# Altium footprint library TranDangKhoa-LIB.PcbLib: 1435 footprints (part 60 of 90)
Each footprint in its own frame and in the unit in brackets; x right, y up, seen from the top. Pads: shape width x height; smd on the part's side, far side on the other; paste and mask are expansions set on the pad; w line width, h text height; cw(c..) or ccw(c..) is an arc to the next point about the centre after c.
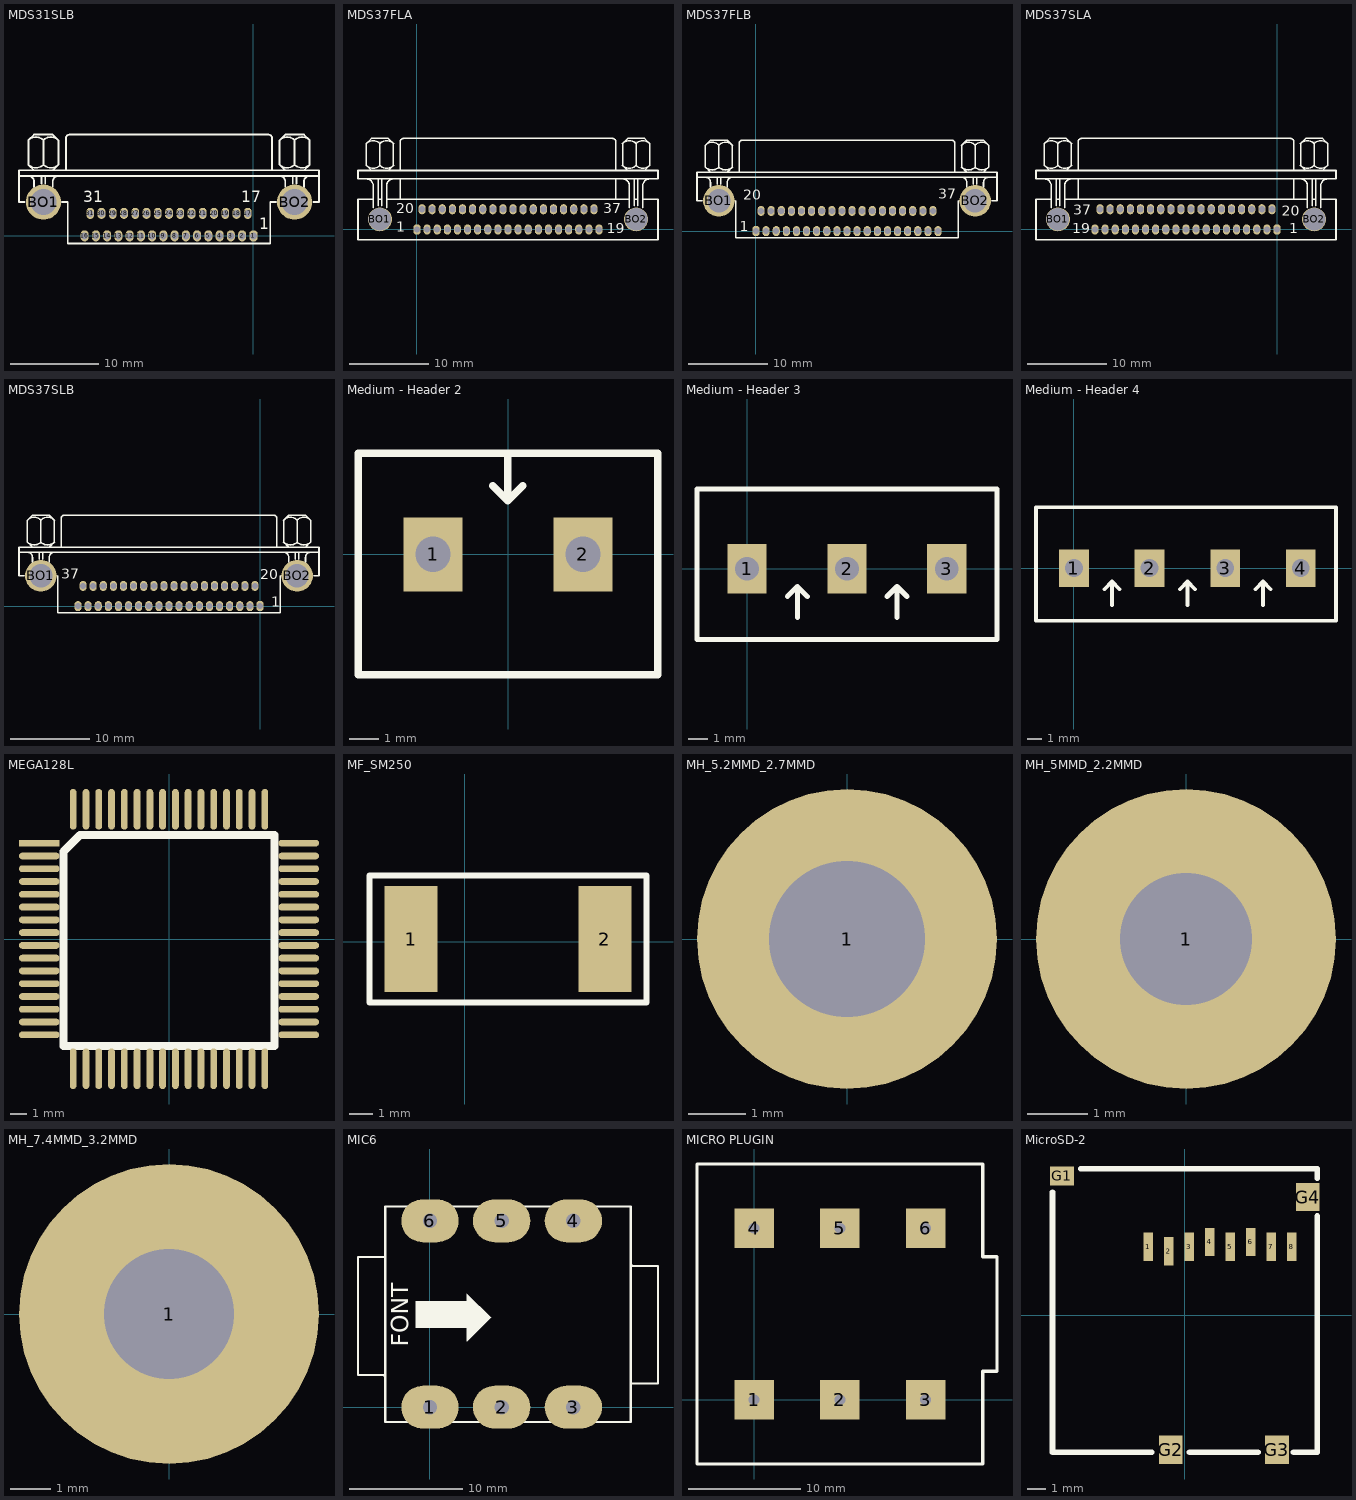
[diagram p59: the footprints below, top view; thin cyan lines are the x and y axes]

## MDS31SLB [mil]
pads (33):
  oct 35x50 hole 30: 1(0,0)
  oval 35x50 hole 30: 2(-50,0) 3(-100,0) 4(-150,0) 5(-200,0) 6(-250,0) 7(-300,0) 8(-350,0) 9(-400,0) 10(-450,0) 11(-500,0) 12(-550,0) 13(-600,0) 14(-650,0) 15(-700,0) 16(-750,0) 17(-25,100) 18(-75,100) 19(-125,100) 20(-175,100) 21(-225,100) 22(-275,100) 23(-325,100) 24(-375,100) 25(-425,100) 26(-475,100) 27(-525,100) 28(-575,100) 29(-625,100) 30(-675,100) 31(-725,100)
  round 156.67 hole 115: BO1(-933.33,150) BO2(183.33,150)
Top Overlay:
  lines w8: -1016.67,150 -1041.67,150 -1041.67,266.67 ; -1000.25,316.41 ccw(c-966.67,350) -933.08,316.41 ; -1000.25,425.25 cw(c-966.67,391.67) -933.08,425.25 ; -1000,266.67 cw(c-1000,241.67) -975,241.67 -975,216.67 ; -975,291.67 -1000,316.67 -1000,425 -975,450 -891.67,450 -866.67,425 -866.67,316.67 -891.67,291.67 ; -941.67,233.33 -941.67,266.67 ; -933.59,316.41 ccw(c-900,350) -866.41,316.41 ; -933.59,425.25 cw(c-900,391.67) -866.41,425.25 ; -933.33,316.67 -933.33,425 ; -925,233.33 -925,266.67 ; -891.67,216.67 -891.67,241.67 cw(c-866.67,241.67) -866.67,266.67 ; -850,150 -825,150 -825,-33.33 75,-33.33 75,150 100,150 ; -833.33,291.67 -833.33,433.33 cw(c-816.67,433.33) -816.67,450 66.67,450 cw(c66.67,433.33) 83.33,433.33 83.33,291.67 ; 116.41,316.41 ccw(c150,350) 183.59,316.41 ; 116.41,425.25 cw(c150,391.67) 183.59,425.25 ; 116.67,266.67 cw(c116.67,241.67) 141.67,241.67 141.67,216.67 ; 141.67,291.67 116.67,316.67 116.67,425 141.67,450 225,450 250,425 250,316.67 225,291.67 ; 175,233.33 175,266.67 ; 183.08,316.41 ccw(c216.67,350) 250.25,316.41 ; 183.08,425.25 cw(c216.67,391.67) 250.25,425.25 ; 183.33,316.67 183.33,425 ; 191.67,233.33 191.67,266.67 ; 225,216.67 225,241.67 cw(c250,241.67) 250,266.67 ; 266.67,150 291.67,150 291.67,266.67 ; -1041.67,266.67 -1041.67,291.67 291.67,291.67 291.67,266.67 ; -1041.67,266.67 291.67,266.67
  text "17" at -55,150 h50
  text "1" at 25,30 h50
  text "31" at -755,150 h50

## MDS37FLA [mil]
pads (39):
  oct 35x50 hole 30: 1(0,0)
  oval 35x50 hole 30: 2(50,0) 3(100,0) 4(150,0) 5(200,0) 6(250,0) 7(300,0) 8(350,0) 9(400,0) 10(450,0) 11(500,0) 12(550,0) 13(600,0) 14(650,0) 15(700,0) 16(750,0) 17(800,0) 18(850,0) 19(900,0) 20(25,100) 21(75,100) 22(125,100) 23(175,100) 24(225,100) 25(275,100) 26(325,100) 27(375,100) 28(425,100) 29(475,100) 30(525,100) 31(575,100) 32(625,100) 33(675,100) 34(725,100) 35(775,100) 36(825,100) 37(875,100)
  round 118.33 hole 110.83: BO1(-183.33,50) BO2(1083.33,50)
Top Overlay:
  lines w8: -250.25,316.41 ccw(c-216.67,350) -183.08,316.41 ; -250.25,425.25 cw(c-216.67,391.67) -183.08,425.25 ; -250,250 cw(c-250,216.67) -216.67,216.67 -216.67,108.33 ; -225,291.67 -250,316.67 -250,425 -225,450 -141.67,450 -116.67,425 -116.67,316.67 -141.67,291.67 ; -216.67,150 -291.67,150 -291.67,-50 1191.67,-50 1191.67,150 1116.67,150 ; -191.67,116.67 -191.67,250 ; -191.67,150 -175,150 ; -183.59,316.41 ccw(c-150,350) -116.41,316.41 ; -183.59,425.25 cw(c-150,391.67) -116.41,425.25 ; -183.33,316.67 -183.33,425 ; -175,116.67 -175,250 ; -150,108.33 -150,216.67 cw(c-116.67,216.67) -116.67,250 ; -150,150 466.67,150 1050,150 ; -83.33,150 -83.33,250 ; -83.33,291.67 -83.33,433.33 cw(c-66.67,433.33) -66.67,450 966.67,450 cw(c966.67,433.33) 983.33,433.33 983.33,291.67 ; 983.33,150 983.33,250 ; 1016.41,316.41 ccw(c1050,350) 1083.59,316.41 ; 1016.41,425.25 cw(c1050,391.67) 1083.59,425.25 ; 1016.67,250 cw(c1016.67,216.67) 1050,216.67 1050,108.33 ; 1041.67,291.67 1016.67,316.67 1016.67,425 1041.67,450 1125,450 1150,425 1150,316.67 1125,291.67 ; 1075,116.67 1075,250 ; 1075,150 1091.67,150 ; 1083.08,316.41 ccw(c1116.67,350) 1150.25,316.41 ; 1083.08,425.25 cw(c1116.67,391.67) 1150.25,425.25 ; 1083.33,316.67 1083.33,425 ; 1091.67,116.67 1091.67,250 ; 1116.67,108.33 1116.67,216.67 cw(c1150,216.67) 1150,250 ; -291.67,250 1191.67,250 1191.67,291.67 -291.67,291.67 -291.67,250
  text "20" at -102.26,80.96 h50
  text "19" at 938.95,-18.18 h50
  text "37" at 920,80 h50
  text "1" at -101.58,-12.53 h50

## MDS37FLB [mil]
pads (39):
  oct 35x50 hole 30: 1(0,0)
  oval 35x50 hole 30: 2(50,0) 3(100,0) 4(150,0) 5(200,0) 6(250,0) 7(300,0) 8(350,0) 9(400,0) 10(450,0) 11(500,0) 12(550,0) 13(600,0) 14(650,0) 15(700,0) 16(750,0) 17(800,0) 18(850,0) 19(900,0) 20(25,100) 21(75,100) 22(125,100) 23(175,100) 24(225,100) 25(275,100) 26(325,100) 27(375,100) 28(425,100) 29(475,100) 30(525,100) 31(575,100) 32(625,100) 33(675,100) 34(725,100) 35(775,100) 36(825,100) 37(875,100)
  round 156.67 hole 115: BO1(-183.33,150) BO2(1083.33,150)
Top Overlay:
  lines w8: -266.67,150 -291.67,150 -291.67,266.67 ; -250.25,316.41 ccw(c-216.67,350) -183.08,316.41 ; -250.25,425.25 cw(c-216.67,391.67) -183.08,425.25 ; -250,266.67 cw(c-250,241.67) -225,241.67 -225,216.67 ; -225,291.67 -250,316.67 -250,425 -225,450 -141.67,450 -116.67,425 -116.67,316.67 -141.67,291.67 ; -191.67,233.33 -191.67,266.67 ; -183.59,316.41 ccw(c-150,350) -116.41,316.41 ; -183.59,425.25 cw(c-150,391.67) -116.41,425.25 ; -183.33,316.67 -183.33,425 ; -175,233.33 -175,266.67 ; -141.67,216.67 -141.67,241.67 cw(c-116.67,241.67) -116.67,266.67 ; -100,150 -100,-33.33 1000,-33.33 1000,150 ; -83.33,291.67 -83.33,433.33 cw(c-66.67,433.33) -66.67,450 966.67,450 cw(c966.67,433.33) 983.33,433.33 983.33,291.67 ; 1016.41,316.41 ccw(c1050,350) 1083.59,316.41 ; 1016.41,425.25 cw(c1050,391.67) 1083.59,425.25 ; 1016.67,266.67 cw(c1016.67,241.67) 1041.67,241.67 1041.67,216.67 ; 1041.67,291.67 1016.67,316.67 1016.67,425 1041.67,450 1125,450 1150,425 1150,316.67 1125,291.67 ; 1075,233.33 1075,266.67 ; 1083.08,316.41 ccw(c1116.67,350) 1150.25,316.41 ; 1083.08,425.25 cw(c1116.67,391.67) 1150.25,425.25 ; 1083.33,316.67 1083.33,425 ; 1091.67,233.33 1091.67,266.67 ; 1125,216.67 1125,241.67 cw(c1150,241.67) 1150,266.67 ; 1166.67,150 1191.67,150 1191.67,266.67 ; -291.67,266.67 -291.67,291.67 1191.67,291.67 1191.67,266.67 ; -291.67,266.67 1191.67,266.67
  text "37" at 900,160 h50
  text "20" at -62.44,156.33 h50
  text "1" at -80,0 h50

## MDS37SLA [mil]
pads (39):
  oct 35x50 hole 30: 1(0,0)
  oval 35x50 hole 30: 2(-50,0) 3(-100,0) 4(-150,0) 5(-200,0) 6(-250,0) 7(-300,0) 8(-350,0) 9(-400,0) 10(-450,0) 11(-500,0) 12(-550,0) 13(-600,0) 14(-650,0) 15(-700,0) 16(-750,0) 17(-800,0) 18(-850,0) 19(-900,0) 20(-25,100) 21(-75,100) 22(-125,100) 23(-175,100) 24(-225,100) 25(-275,100) 26(-325,100) 27(-375,100) 28(-425,100) 29(-475,100) 30(-525,100) 31(-575,100) 32(-625,100) 33(-675,100) 34(-725,100) 35(-775,100) 36(-825,100) 37(-875,100)
  round 118.33 hole 110.83: BO1(-1083.33,50) BO2(183.33,50)
Top Overlay:
  lines w8: -1150.25,316.41 ccw(c-1116.67,350) -1083.08,316.41 ; -1150.25,425.25 cw(c-1116.67,391.67) -1083.08,425.25 ; -1150,250 cw(c-1150,216.67) -1116.67,216.67 -1116.67,108.33 ; -1125,291.67 -1150,316.67 -1150,425 -1125,450 -1041.67,450 -1016.67,425 -1016.67,316.67 -1041.67,291.67 ; -1116.67,150 -1191.67,150 -1191.67,-50 291.67,-50 291.67,150 216.67,150 ; -1091.67,116.67 -1091.67,250 ; -1091.67,150 -1075,150 ; -1083.59,316.41 ccw(c-1050,350) -1016.41,316.41 ; -1083.59,425.25 cw(c-1050,391.67) -1016.41,425.25 ; -1083.33,316.67 -1083.33,425 ; -1075,116.67 -1075,250 ; -1050,108.33 -1050,216.67 cw(c-1016.67,216.67) -1016.67,250 ; -1050,150 150,150 ; -983.33,150 -983.33,250 ; -983.33,291.67 -983.33,433.33 cw(c-966.67,433.33) -966.67,450 66.67,450 cw(c66.67,433.33) 83.33,433.33 83.33,291.67 ; 83.33,150 83.33,250 ; 116.41,316.41 ccw(c150,350) 183.59,316.41 ; 116.41,425.25 cw(c150,391.67) 183.59,425.25 ; 116.67,250 cw(c116.67,216.67) 150,216.67 150,108.33 ; 141.67,291.67 116.67,316.67 116.67,425 141.67,450 225,450 250,425 250,316.67 225,291.67 ; 175,116.67 175,250 ; 175,150 191.67,150 ; 183.08,316.41 ccw(c216.67,350) 250.25,316.41 ; 183.08,425.25 cw(c216.67,391.67) 250.25,425.25 ; 183.33,316.67 183.33,425 ; 191.67,116.67 191.67,250 ; 216.67,108.33 216.67,216.67 cw(c250,216.67) 250,250 ; -1191.67,250 -1191.67,291.67 291.67,291.67 291.67,250 -1191.67,250
  text "1" at 60,-20 h50
  text "19" at -1012.73,-18.18 h50
  text "37" at -1006.58,73.44 h50
  text "20" at 23.98,68.07 h50

## MDS37SLB [mil]
pads (39):
  oct 35x50 hole 30: 1(0,0)
  oval 35x50 hole 30: 2(-50,0) 3(-100,0) 4(-150,0) 5(-200,0) 6(-250,0) 7(-300,0) 8(-350,0) 9(-400,0) 10(-450,0) 11(-500,0) 12(-550,0) 13(-600,0) 14(-650,0) 15(-700,0) 16(-750,0) 17(-800,0) 18(-850,0) 19(-900,0) 20(-25,100) 21(-75,100) 22(-125,100) 23(-175,100) 24(-225,100) 25(-275,100) 26(-325,100) 27(-375,100) 28(-425,100) 29(-475,100) 30(-525,100) 31(-575,100) 32(-625,100) 33(-675,100) 34(-725,100) 35(-775,100) 36(-825,100) 37(-875,100)
  round 156.67 hole 115: BO1(-1083.33,150) BO2(183.33,150)
Top Overlay:
  lines w8: -1166.67,150 -1191.67,150 -1191.67,266.67 ; -1150.25,316.41 ccw(c-1116.67,350) -1083.08,316.41 ; -1150.25,425.25 cw(c-1116.67,391.67) -1083.08,425.25 ; -1150,266.67 cw(c-1150,241.67) -1125,241.67 -1125,216.67 ; -1125,291.67 -1150,316.67 -1150,425 -1125,450 -1041.67,450 -1016.67,425 -1016.67,316.67 -1041.67,291.67 ; -1091.67,233.33 -1091.67,266.67 ; -1083.59,316.41 ccw(c-1050,350) -1016.41,316.41 ; -1083.59,425.25 cw(c-1050,391.67) -1016.41,425.25 ; -1083.33,316.67 -1083.33,425 ; -1075,233.33 -1075,266.67 ; -1041.67,216.67 -1041.67,241.67 cw(c-1016.67,241.67) -1016.67,266.67 ; -1000,150 -1000,-33.33 100,-33.33 100,150 ; -983.33,291.67 -983.33,433.33 cw(c-966.67,433.33) -966.67,450 66.67,450 cw(c66.67,433.33) 83.33,433.33 83.33,291.67 ; 116.41,316.41 ccw(c150,350) 183.59,316.41 ; 116.41,425.25 cw(c150,391.67) 183.59,425.25 ; 116.67,266.67 cw(c116.67,241.67) 141.67,241.67 141.67,216.67 ; 141.67,291.67 116.67,316.67 116.67,425 141.67,450 225,450 250,425 250,316.67 225,291.67 ; 175,233.33 175,266.67 ; 183.08,316.41 ccw(c216.67,350) 250.25,316.41 ; 183.08,425.25 cw(c216.67,391.67) 250.25,425.25 ; 183.33,316.67 183.33,425 ; 191.67,233.33 191.67,266.67 ; 225,216.67 225,241.67 cw(c250,241.67) 250,266.67 ; 266.67,150 291.67,150 291.67,266.67 ; -1191.67,266.67 -1191.67,291.67 291.67,291.67 291.67,266.67 ; -1191.67,266.67 291.67,266.67
  text "1" at 56.69,-2.62 h50
  text "20" at 1.59,133.35 h50
  text "37" at -982.06,136.6 h50

## Medium - Header 2 [mm]
pads (2):
  rect 2x2.5 hole 1.2: 1(-2.54,0) 2(2.54,0)
Top Overlay:
  lines w0.254: -0.521,2.324 -0.013,1.816 ; -0.013,3.378 -0.013,1.816 ; 0.495,2.324 -0.013,1.816 ; -5.08,-4.077 5.08,-4.077 5.08,3.429 -5.08,3.429 -5.08,-4.077
3D body "SW3dPS-KRM2.STEP": height 10, standoff -4, extent -5,-4.071 5,3.429

## Medium - Header 3 [mm]
pads (3):
  rect 2x2.5 hole 1.2: 1(0,0) 2(5.08,0) 3(10.147,0)
Top Overlay:
  lines w0.254: 2.045,-1.41 2.553,-0.902 ; 2.553,-2.464 2.553,-0.902 ; 3.061,-1.41 2.553,-0.902 ; 7.112,-1.41 7.62,-0.902 ; 7.62,-2.464 7.62,-0.902 ; 8.128,-1.41 7.62,-0.902 ; -2.54,-3.581 12.7,-3.581 12.7,4.064 -2.54,4.064 -2.54,-3.581
3D body "SW3DPS-HDR1x3-MED-GREEN.STEP": height 10, standoff -4, extent -2.42,-3.505 12.58,3.995

## Medium - Header 4 [mm]
pads (4):
  rect 2x2.5 hole 1.2: 1(0,0) 2(5.08,0) 3(10.147,0) 4(15.215,0)
Top Overlay:
  lines w0.254: 2.045,-1.41 2.553,-0.902 ; 2.553,-2.464 2.553,-0.902 ; 3.061,-1.41 2.553,-0.902 ; 7.112,-1.41 7.62,-0.902 ; 7.62,-2.464 7.62,-0.902 ; 8.128,-1.41 7.62,-0.902 ; 12.179,-1.41 12.687,-0.902 ; 12.687,-2.464 12.687,-0.902 ; 13.195,-1.41 12.687,-0.902 ; -2.54,-3.531 17.577,-3.531 17.577,4.089 -2.54,4.089 -2.54,-3.531
3D body "SW3DPS-HDR1x4-MED-GREEN.STEP": height 10, standoff -4, extent -2.431,-3.461 17.569,4.039

## MEGA128L [mm]
pads (64):
  rect 2.54x0.432 smd: 1(-8.125,6)
  oval 2.54x0.432 smd: 2(-8.125,5.2) 3(-8.125,4.4) 4(-8.125,3.6) 5(-8.125,2.8) 6(-8.125,2) 7(-8.125,1.2) 8(-8.125,0.4) 9(-8.125,-0.4) 10(-8.125,-1.2) 11(-8.125,-2) 12(-8.125,-2.8) 13(-8.125,-3.6) 14(-8.125,-4.4) 15(-8.125,-5.2) 16(-8.125,-6) 33(8.125,-6) 34(8.125,-5.2) 35(8.125,-4.4) 36(8.125,-3.6) 37(8.125,-2.8) 38(8.125,-2) 39(8.125,-1.2) 40(8.125,-0.4) 41(8.125,0.4) 42(8.125,1.2) 43(8.125,2) 44(8.125,2.8) 45(8.125,3.6) 46(8.125,4.4) 47(8.125,5.2) 48(8.125,6)
  oval 0.432x2.54 smd: 17(-6,-8.125) 18(-5.2,-8.125) 19(-4.4,-8.125) 20(-3.6,-8.125) 21(-2.8,-8.125) 22(-2,-8.125) 23(-1.2,-8.125) 24(-0.4,-8.125) 25(0.4,-8.125) 26(1.2,-8.125) 27(2,-8.125) 28(2.8,-8.125) 29(3.6,-8.125) 30(4.4,-8.125) 31(5.2,-8.125) 32(6,-8.125) 49(6,8.125) 50(5.2,8.125) 51(4.4,8.125) 52(3.6,8.125) 53(2.8,8.125) 54(2,8.125) 55(1.2,8.125) 56(0.4,8.125) 57(-0.4,8.125) 58(-1.2,8.125) 59(-2,8.125) 60(-2.8,8.125) 61(-3.6,8.125) 62(-4.4,8.125) 63(-5.2,8.125) 64(-6,8.125)
Top Overlay:
  lines w0.508: -6.601,-6.7 -6.601,5.492 -5.585,6.508 6.607,6.508 6.607,-6.7 -6.601,-6.7

## MF_SM250 [mm]
pads (2):
  rect 2.3x4.6 smd: 1(-2.323,0.127) 2(6.077,0.127)
Top Overlay:
  lines w0.254: -4.123,-2.623 7.877,-2.623 7.877,2.877 7.627,2.877 -4.123,2.877 -4.123,-2.623
3D body: height 2.79, standoff 2.03, extent -0.776,-2.899 6.276,3.246
3D body: height 3.05, standoff 0, extent -2.784,-1.645 -2.14,2.136
3D body: height 3.17, standoff 2.79, extent -2.766,-3.012 6.276,3.339
3D body: height 2.16, standoff 1.68, extent -0.81,-3.005 6.332,3.338
3D body: height 2.03, standoff 0, extent 5.685,-1.56 6.329,2.221

## MH_5.2MMD_2.7MMD [mm] "Creator MM"
pads (1):
  round 5.2 / inner round 3.683 / far side round 5.2 hole 2.7: 1(0,0)

## MH_5MMD_2.2MMD [mm]
pads (1):
  round 5 / inner round 3.683 / far side round 5 hole 2.2: 1(0,0)

## MH_7.4MMD_3.2MMD [mm]
pads (1):
  round 7.4 / inner round 3.683 / far side round 7.4 hole 3.2 mask+0.025: 1(0,0)

## MIC6 [mm] "Jac Mic 6 pin to"
pads (6):
  oval 5.08x3.81 hole 1.27: 1(0,0) 2(6.35,0) 3(12.7,0) 4(12.7,16.51) 5(6.35,16.51) 6(0,16.51)
Top Overlay:
  region: -1.27,9.373 -1.27,7.036 3.302,7.036 3.277,7.061 3.277,5.842 3.302,5.842 5.385,7.925 5.41,7.925 3.277,10.058 3.277,9.373
  lines w0.178: -3.962,-1.295 -3.962,17.755 ; -3.962,2.261 -3.962,13.335 -4.013,13.284 -6.375,13.284 -6.375,2.845 -4.115,2.845 -3.962,2.692 ; -3.962,17.78 17.78,17.78 17.78,14.986 ; -3.937,-1.321 -3.912,-1.295 -3.886,-1.321 17.78,-1.321 17.78,2.083 ; 17.78,12.675 17.932,12.522 20.193,12.522 20.193,2.083 17.831,2.083 17.78,2.032 17.78,15.088
  text "FONT" at -1.905,5.334 h1.52

## MICRO PLUGIN [mil]
pads (6):
  rect 137.8x137.8 / inner round 62 / far side rect 137.8x137.8 hole 38: 1(0,0) 2(300,0) 3(600,0) 4(0,600) 5(300,600) 6(600,600)
Top Overlay:
  lines w11.82: -200,-225 -200,825 800,825 800,500 850,500 850,100 800,100 800,-225 -200,-225

## MicroSD-2 [mil]
pads (12):
  rect 20x60 smd: 1(-77,145) 2(-33.71,135) 3(9.57,145) 4(52.86,155) 5(96.14,145) 6(139.43,155) 7(182.71,145) 8(226,145)
  rect 50x40 smd: G1(-260,295)
  rect 50x60 smd: G2(-30,-285) G3(195,-285) G4(260,250)
Top Overlay:
  lines w12: -280,260 -280,-290 -70,-290 ; -220,310 280,310 280,290 ; 10,-290 155,-290 ; 230,-290 280,-290 280,210
3D body "User Library-MEM2050.step": height 72.83, standoff -1.97, extent -279.53,-288.47 281.49,309.95